# Altium footprint library MMT_MCUs_ICs.PcbLib: 44 footprints (part 2 of 3)
Each footprint in its own frame and in the unit in brackets; x right, y up, seen from the top. Pads: shape width x height; smd on the part's side, far side on the other; paste and mask are expansions set on the pad; w line width, h text height; cw(c..) or ccw(c..) is an arc to the next point about the centre after c.
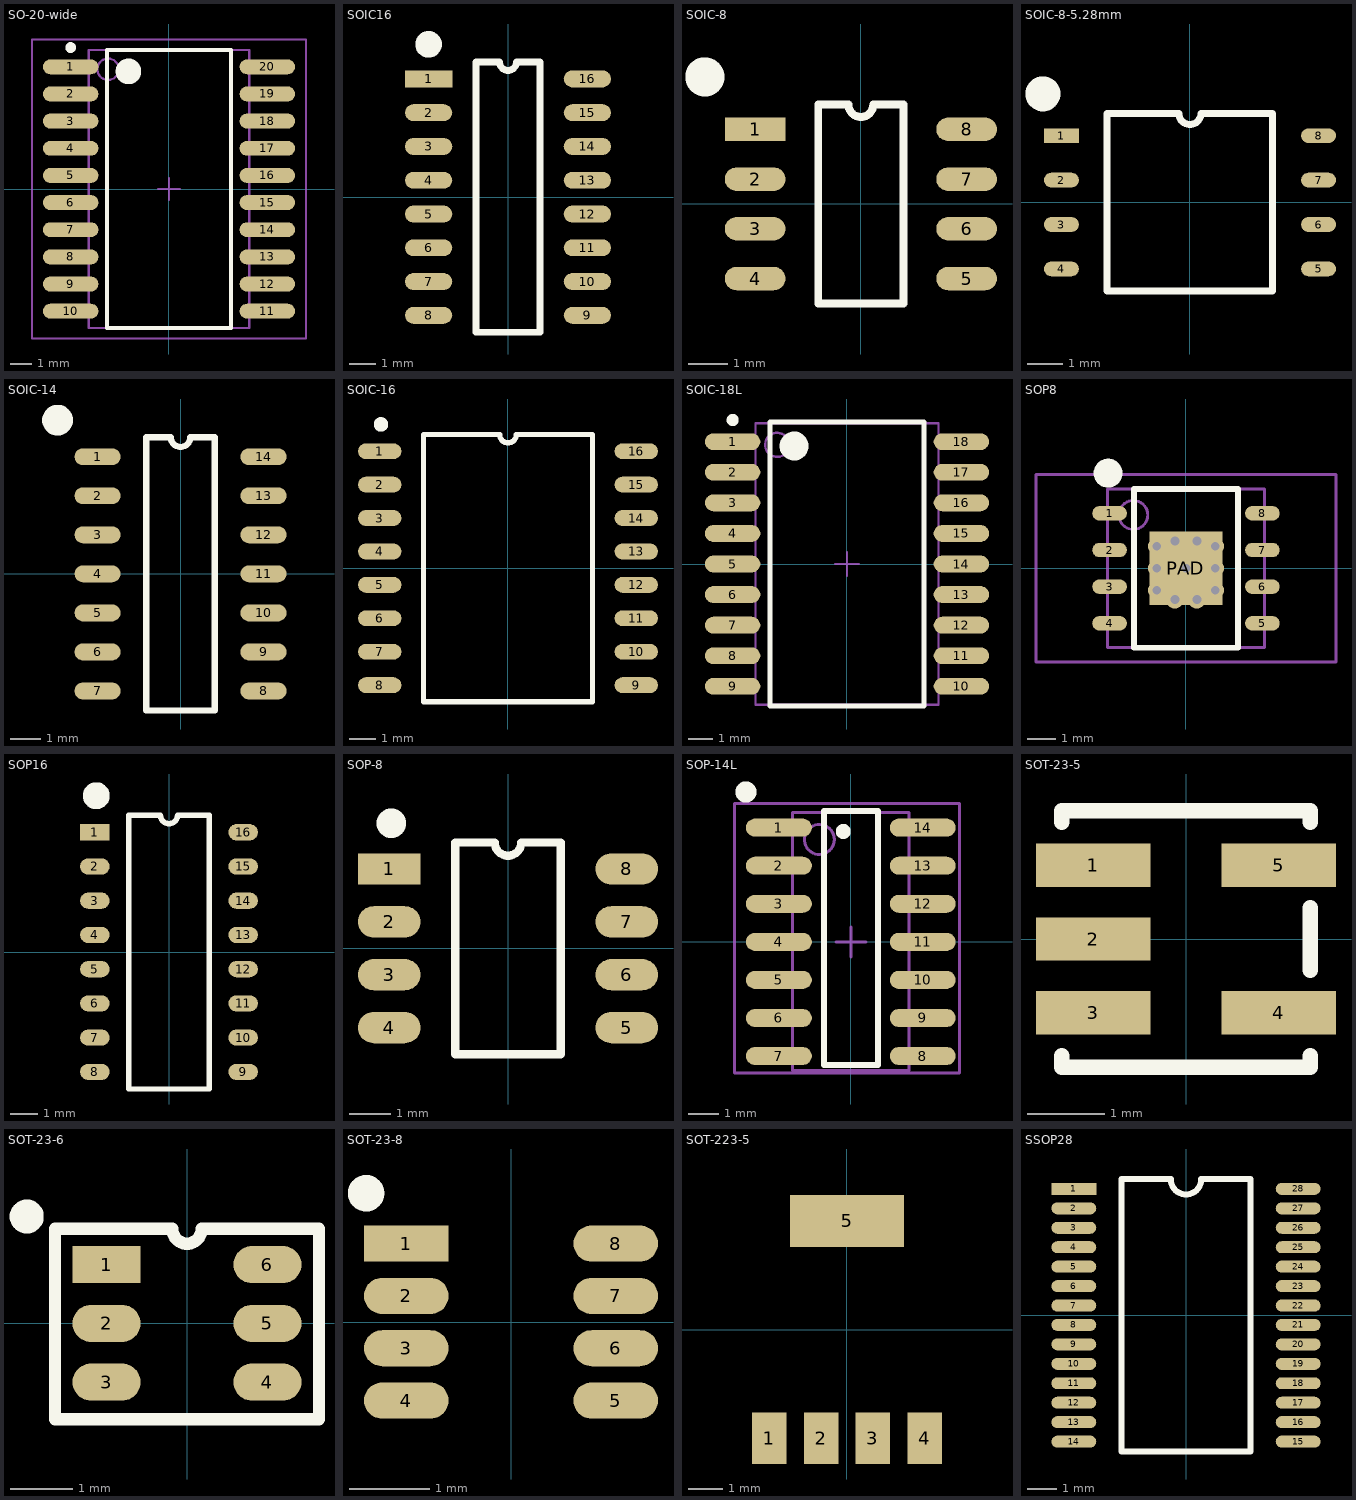
[diagram p1: the footprints below, top view; thin cyan lines are the x and y axes]

## SO-20-wide [mm] "SOIC, 20-Leads, Body 12.8x7.5mm, Pitch 1.27mm, IPC Low Density"
height 2.65
pads (20):
  oval 2.6x0.7 smd: 1(-4.6,5.715) 2(-4.6,4.445) 3(-4.6,3.175) 4(-4.6,1.905) 5(-4.6,0.635) 6(-4.6,-0.635) 7(-4.6,-1.905) 8(-4.6,-3.175) 9(-4.6,-4.445) 10(-4.6,-5.715) 11(4.6,-5.715) 12(4.6,-4.445) 13(4.6,-3.175) 14(4.6,-1.905) 15(4.6,-0.635) 16(4.6,0.635) 17(4.6,1.905) 18(4.6,3.175) 19(4.6,4.445) 20(4.6,5.715)
Top Overlay:
  circle w0.6: c-1.9,5.5 r0.3
  circle w0.25: c-4.6,6.615 r0.125
  lines w0.2: -2.9,-6.5 2.9,-6.5 2.9,6.5 -2.9,6.5 -2.9,-6.5
Mechanical 13:
  circle w0.1: c-2.85,5.6 r0.5
  lines w0.1: -3.75,-6.5 3.75,-6.5 3.75,6.5 -3.75,6.5 -3.75,-6.5
Mechanical 15:
  lines w0.1: -0.5,0 0.5,0 ; 0,-0.5 0,0.5 ; -6.4,-7 6.4,-7 6.4,7 -6.4,7 -6.4,-7
3D body "User Library-SO-20 (Wide).STEP": height 2.7, standoff 0, extent -5.15,-6.4 5.15,6.4

## SOIC16 [mil]
pads (16):
  rect 70x25 smd: 1(-117.5,175)
  oval 70x25 smd: 2(-117.5,125) 3(-117.5,75) 4(-117.5,25) 5(-117.5,-25) 6(-117.5,-75) 7(-117.5,-125) 8(-117.5,-175) 9(117.5,-175) 10(117.5,-125) 11(117.5,-75) 12(117.5,-25) 13(117.5,25) 14(117.5,75) 15(117.5,125) 16(117.5,175)
Top Overlay:
  circle w23.62: c-117.5,226.18 r7.87
  lines w10: -47.5,-200 47.5,-200 47.5,200 12.5,200 cw(c0,200) -12.5,200 -47.5,200 -47.5,-200
3D body "User Library-SOIC-16.STEP": height 55.12, standoff 0, extent -117.6,-194.88 118.62,194.89

## SOIC-8 [mm]
pads (8):
  rect 1.55x0.6 smd: 1(-2.7,1.905)
  oval 1.55x0.6 smd: 2(-2.7,0.635) 3(-2.7,-0.635) 4(-2.7,-1.905) 5(2.7,-1.905) 6(2.7,-0.635) 7(2.7,0.635) 8(2.7,1.905)
Top Overlay:
  circle w0.6: c-3.985,3.245 r0.2
  lines w0.2: -1.09,-2.54 -1.09,2.54 -0.318,2.54 ccw(c0,2.54) 0.318,2.54 1.09,2.54 1.09,-2.54 -1.09,-2.54
3D body "User Library-SOIC-8-1.step": height 1.75, standoff 0, extent -3,-2.45 3,2.45

## SOIC-8-5.28mm [mm]
pads (8):
  rect 1x0.42 smd: 1(-3.675,1.905)
  oval 1x0.42 smd: 2(-3.675,0.635) 3(-3.675,-0.635) 4(-3.675,-1.905) 5(3.675,-1.905) 6(3.675,-0.635) 7(3.675,0.635) 8(3.675,1.905)
Top Overlay:
  circle w0.6: c-4.2,3.1 r0.2
  lines w0.2: -2.365,-2.54 -2.365,2.54 -0.318,2.54 ccw(c0,2.54) 0.318,2.54 2.365,2.54 2.365,-2.54 -2.365,-2.54
3D body "User Library-SOIC-8-2.step": height 2.58, standoff 0, extent -4,-2.625 4,2.625

## SOIC-14 [mm]
pads (14):
  oval 1.5x0.55 smd: 1(-2.7,3.81) 2(-2.7,2.54) 3(-2.7,1.27) 4(-2.7,0) 5(-2.7,-1.27) 6(-2.7,-2.54) 7(-2.7,-3.81) 8(2.7,-3.81) 9(2.7,-2.54) 10(2.7,-1.27) 11(2.7,0) 12(2.7,1.27) 13(2.7,2.54) 14(2.7,3.81)
Top Overlay:
  circle w0.6: c-4,5 r0.2
  lines w0.2: -1.115,-4.445 1.115,-4.445 1.115,4.445 0.318,4.445 cw(c0,4.445) -0.318,4.445 -1.115,4.445 -1.115,-4.445
3D body "User Library-SOIC14-150-1.step": height 1.75, standoff 0, extent -2.9,-4.28 2.9,4.25

## SOIC-16 [mm]
pads (16):
  oval 1.65x0.6 smd: 1(-4.875,4.445) 2(-4.875,3.175) 3(-4.875,1.905) 4(-4.875,0.635) 5(-4.875,-0.635) 6(-4.875,-1.905) 7(-4.875,-3.175) 8(-4.875,-4.445) 9(4.875,-4.445) 10(4.875,-3.175) 11(4.875,-1.905) 12(4.875,-0.635) 13(4.875,0.635) 14(4.875,1.905) 15(4.875,3.175) 16(4.875,4.445)
Top Overlay:
  circle w0.3: c-4.826,5.461 r0.125
  lines w0.2: -3.215,-5.08 3.215,-5.08 3.215,5.08 0.318,5.08 cw(c0,5.08) -0.318,5.08 -3.215,5.08 -3.215,-5.08
3D body "User Library-SOIC16_Wide_JEDEC_MS-013AA.step": height 2.49, standoff -0.16, extent -5.353,-5.209 5.277,5.291

## SOIC-18L [mm] "SOIC, 18-Leads, Body 11.6x7.5mm, Pitch 1.27mm, IPC Low Density"
height 2.65
pads (18):
  oval 2.3x0.7 smd: 1(-4.75,5.08) 2(-4.75,3.81) 3(-4.75,2.54) 4(-4.75,1.27) 5(-4.75,0) 6(-4.75,-1.27) 7(-4.75,-2.54) 8(-4.75,-3.81) 9(-4.75,-5.08) 10(4.75,-5.08) 11(4.75,-3.81) 12(4.75,-2.54) 13(4.75,-1.27) 14(4.75,0) 15(4.75,1.27) 16(4.75,2.54) 17(4.75,3.81) 18(4.75,5.08)
Top Overlay:
  circle w0.6: c-2.2,4.9 r0.3
  circle w0.25: c-4.75,5.98 r0.125
  lines w0.2: -3.2,-5.9 3.2,-5.9 3.2,5.9 -3.2,5.9 -3.2,-5.9
Mechanical 13:
  circle w0.1: c-2.9,4.95 r0.5
  lines w0.1: -3.8,-5.85 3.8,-5.85 3.8,5.85 -3.8,5.85 -3.8,-5.85
Mechanical 15:
  lines w0.1: -0.5,0 0.5,0 ; 0,-0.5 0,0.5
3D body "SOIC-18-Wide.step": height 1.7, standoff 0, extent -5.359,-5.588 5.283,5.588

## SOP8 [mm] "8-Pin Plastic Medium Body Small Outline Package 1.27 mm Pitch, IPC Low Density"
height 2.04
pads (9):
  oval 1.2x0.5 smd: 1(-2.65,1.905) 2(-2.65,0.635) 3(-2.65,-0.635) 4(-2.65,-1.905) 5(2.65,-1.905) 6(2.65,-0.635) 7(2.65,0.635) 8(2.65,1.905)
  rect 2.54x2.54 smd: PAD(0,0)
via 0,0 diameter 0.61 hole 0.305
via -0.383,0.949 diameter 0.61 hole 0.305
via 0.379,0.949 diameter 0.61 hole 0.305
via -1.016,0 diameter 0.61 hole 0.305
via -1.016,-0.762 diameter 0.61 hole 0.305
via -1.016,0.762 diameter 0.61 hole 0.305
via 1.016,0.762 diameter 0.61 hole 0.305
via -0.383,-1.083 diameter 0.61 hole 0.305
via 0.379,-1.083 diameter 0.61 hole 0.305
via 1.016,0 diameter 0.61 hole 0.305
via 1.016,-0.762 diameter 0.61 hole 0.305
Top Overlay:
  circle w0.5: c-2.7,3.3 r0.25
  lines w0.2: -1.8,-2.75 1.8,-2.75 1.8,2.75 -1.8,2.75 -1.8,-2.75
Mechanical 13:
  circle w0.1: c-1.825,1.85 r0.5
  lines w0.1: -2.725,-2.75 2.725,-2.75 2.725,2.75 -2.725,2.75 -2.725,-2.75
Mechanical 15:
  lines w0.1: -0.5,0 0.5,0 ; 0,-0.5 0,0.5 ; -5.2,-3.25 5.2,-3.25 5.2,3.25 -5.2,3.25 -5.2,-3.25
3D body "User Library-sop8_model.STEP": height 1.58, standoff 0.02, extent -2.965,-2.436 3.015,2.464

## SOP16 [mm]
pads (16):
  rect 1.1x0.6 smd: 1(-2.75,4.445)
  oval 1.1x0.6 smd: 2(-2.75,3.175) 3(-2.75,1.905) 4(-2.75,0.635) 5(-2.75,-0.635) 6(-2.75,-1.905) 7(-2.75,-3.175) 8(-2.75,-4.445) 9(2.75,-4.445) 10(2.75,-3.175) 11(2.75,-1.905) 12(2.75,-0.635) 13(2.75,0.635) 14(2.75,1.905) 15(2.75,3.175) 16(2.75,4.445)
Top Overlay:
  circle w0.5: c-2.7,5.8 r0.25
  lines w0.2: -1.5,-5.08 1.5,-5.08 1.5,5.08 0.318,5.08 cw(c0,5.08) -0.318,5.08 -1.5,5.08 -1.5,-5.08
3D body "User Library-SOP16.step": height 1.59, standoff 0, extent -3.117,-4.991 3.118,4.99

## SOP-8 [mm]
pads (8):
  rect 1.5x0.75 smd: 1(-2.85,1.905)
  oval 1.5x0.75 smd: 2(-2.85,0.635) 3(-2.85,-0.635) 4(-2.85,-1.905) 5(2.85,-1.905) 6(2.85,-0.635) 7(2.85,0.635) 8(2.85,1.905)
Top Overlay:
  circle w0.508: c-2.8,3 r0.1
  lines w0.2: -1.265,-2.54 1.265,-2.54 1.265,2.54 0.318,2.54 cw(c0,2.54) -0.318,2.54 -1.265,2.54 -1.265,-2.54
3D body "User Library-sop-8.step": height 1.6, standoff 0, extent -3.021,-2.51 3.021,2.51

## SOP-14L [mm] "SOIC, 14-Leads, Body 9.9x3.9mm, Pitch 1.27mm, IPC Medium Density"
height 1.75
pads (14):
  oval 2.2x0.6 smd: 1(-2.4,3.81) 2(-2.4,2.54) 3(-2.4,1.27) 4(-2.4,0) 5(-2.4,-1.27) 6(-2.4,-2.54) 7(-2.4,-3.81) 8(2.4,-3.81) 9(2.4,-2.54) 10(2.4,-1.27) 11(2.4,0) 12(2.4,1.27) 13(2.4,2.54) 14(2.4,3.81)
Top Overlay:
  circle w0.25: c-0.252,3.683 r0.125
  circle w0.508: c-3.5,5 r0.1
  lines w0.2: -0.9,-4.115 -0.9,4.365 0.9,4.365 0.9,-4.115 -0.9,-4.115
Mechanical 13:
  circle w0.1: c-1.05,3.415 r0.5
  lines w0.1: -1.95,-4.293 -1.95,4.315 1.95,4.315 1.95,-4.293 -1.95,-4.293
Mechanical 15:
  lines w0.1: -0.5,0 0.5,0 ; 0,-0.5 0,0.5 ; -3.877,-4.369 -3.877,4.623 3.623,4.623 3.623,-4.369 -3.877,-4.369
3D body "User Library-so14-1.STEP": height 1.7, standoff 0, extent -3.025,-4.36 2.975,4.44

## SOT-23-5 [mil]
pads (5):
  rect 58x22 smd: 1(-47,37.4) 2(-47,0) 3(-47,-37.4) 4(47,-37.4) 5(47,37.4)
Top Overlay:
  lines w7.87: -62.99,-59.06 -62.99,-64.96 62.99,-64.96 62.99,-59.06 ; -62.99,59.06 -62.99,64.96 62.99,64.96 62.99,59.06 ; 62.99,-15.75 62.99,15.75
Mechanical 1:
  lines w1: -59,-47.4 -59,-27.4 -34.5,-27.4 -34.5,-47.4 -59,-47.4 ; -59,-10 -59,10 -34.5,10 -34.5,-10 -59,-10 ; -59,27.4 -59,47.4 -34.5,47.4 -34.5,27.4 -59,27.4 ; 34.5,-47.4 34.5,-27.4 59,-27.4 59,-47.4 34.5,-47.4 ; 34.5,27.4 34.5,47.4 59,47.4 59,27.4 34.5,27.4
3D body "LP2985-33.stp": height 41, standoff -2, extent -56,-57.5 56,57.5

## SOT-23-6 [mm]
pads (6):
  rect 1.1x0.6 smd: 1(-1.3,0.95)
  oval 1.1x0.6 smd: 2(-1.3,0) 3(-1.3,-0.95) 4(1.3,-0.95) 5(1.3,0) 6(1.3,0.95)
Top Overlay:
  circle w0.3: c-2.591,1.727 r0.125
  lines w0.2: -2.134,-1.549 -2.134,1.527 -0.238,1.527 ccw(c0,1.527) 0.238,1.527 2.134,1.527 2.134,-1.549 -2.134,-1.549
3D body "User Library-SOT-23-6.step": height 1.09, standoff 0, extent -1.207,-1.41 1.219,1.384

## SOT-23-8 [mm]
pads (8):
  rect 1.05x0.45 smd: 1(-1.3,0.975)
  oval 1.05x0.45 smd: 2(-1.3,0.325) 3(-1.3,-0.325) 4(-1.3,-0.975) 5(1.3,-0.975) 6(1.3,-0.325) 7(1.3,0.325) 8(1.3,0.975)
Top Overlay:
  circle w0.254: c-1.8,1.6 r0.1
3D body "User Library-SOT-23-8-Thin.STEP": height 1.1, standoff 0, extent -1.475,-1.475 1.475,1.475

## SOT-223-5 [mm]
pads (5):
  rect 1x1.5 smd: 1(-2.25,-3.15) 2(-0.75,-3.15) 3(0.75,-3.15) 4(2.25,-3.15)
  rect 3.3x1.5 smd: 5(0,3.15)
3D body "User Library-User Library-SOT-223-5.step": height 1.61, standoff -0.04, extent -3.25,-3.5 3.25,3.5

## SSOP28 [mm]
pads (28):
  rect 1.5x0.4 smd: 1(-3.75,4.225)
  oval 1.5x0.4 smd: 2(-3.75,3.575) 3(-3.75,2.925) 4(-3.75,2.275) 5(-3.75,1.625) 6(-3.75,0.975) 7(-3.75,0.325) 8(-3.75,-0.325) 9(-3.75,-0.975) 10(-3.75,-1.625) 11(-3.75,-2.275) 12(-3.75,-2.925) 13(-3.75,-3.575) 14(-3.75,-4.225) 15(3.75,-4.225) 16(3.75,-3.575) 17(3.75,-2.925) 18(3.75,-2.275) 19(3.75,-1.625) 20(3.75,-0.975) 21(3.75,-0.325) 22(3.75,0.325) 23(3.75,0.975) 24(3.75,1.625) 25(3.75,2.275) 26(3.75,2.925) 27(3.75,3.575) 28(3.75,4.225)
Top Overlay:
  lines w0.2: -2.165,-4.55 -2.165,4.55 -0.508,4.55 ccw(c0,4.55) 0.508,4.55 2.165,4.55 2.165,-4.55 -2.165,-4.55
3D body "User Library-SSOP-28-1.step": height 2.15, standoff 0, extent -3.878,-5.165 3.878,5.165